# Altium footprint library PCB封装库.PcbLib: 109 footprints (part 3 of 7)
Each footprint in its own frame and in the unit in brackets; x right, y up, seen from the top. Pads: shape width x height; smd on the part's side, far side on the other; paste and mask are expansions set on the pad; w line width, h text height; cw(c..) or ccw(c..) is an arc to the next point about the centre after c.
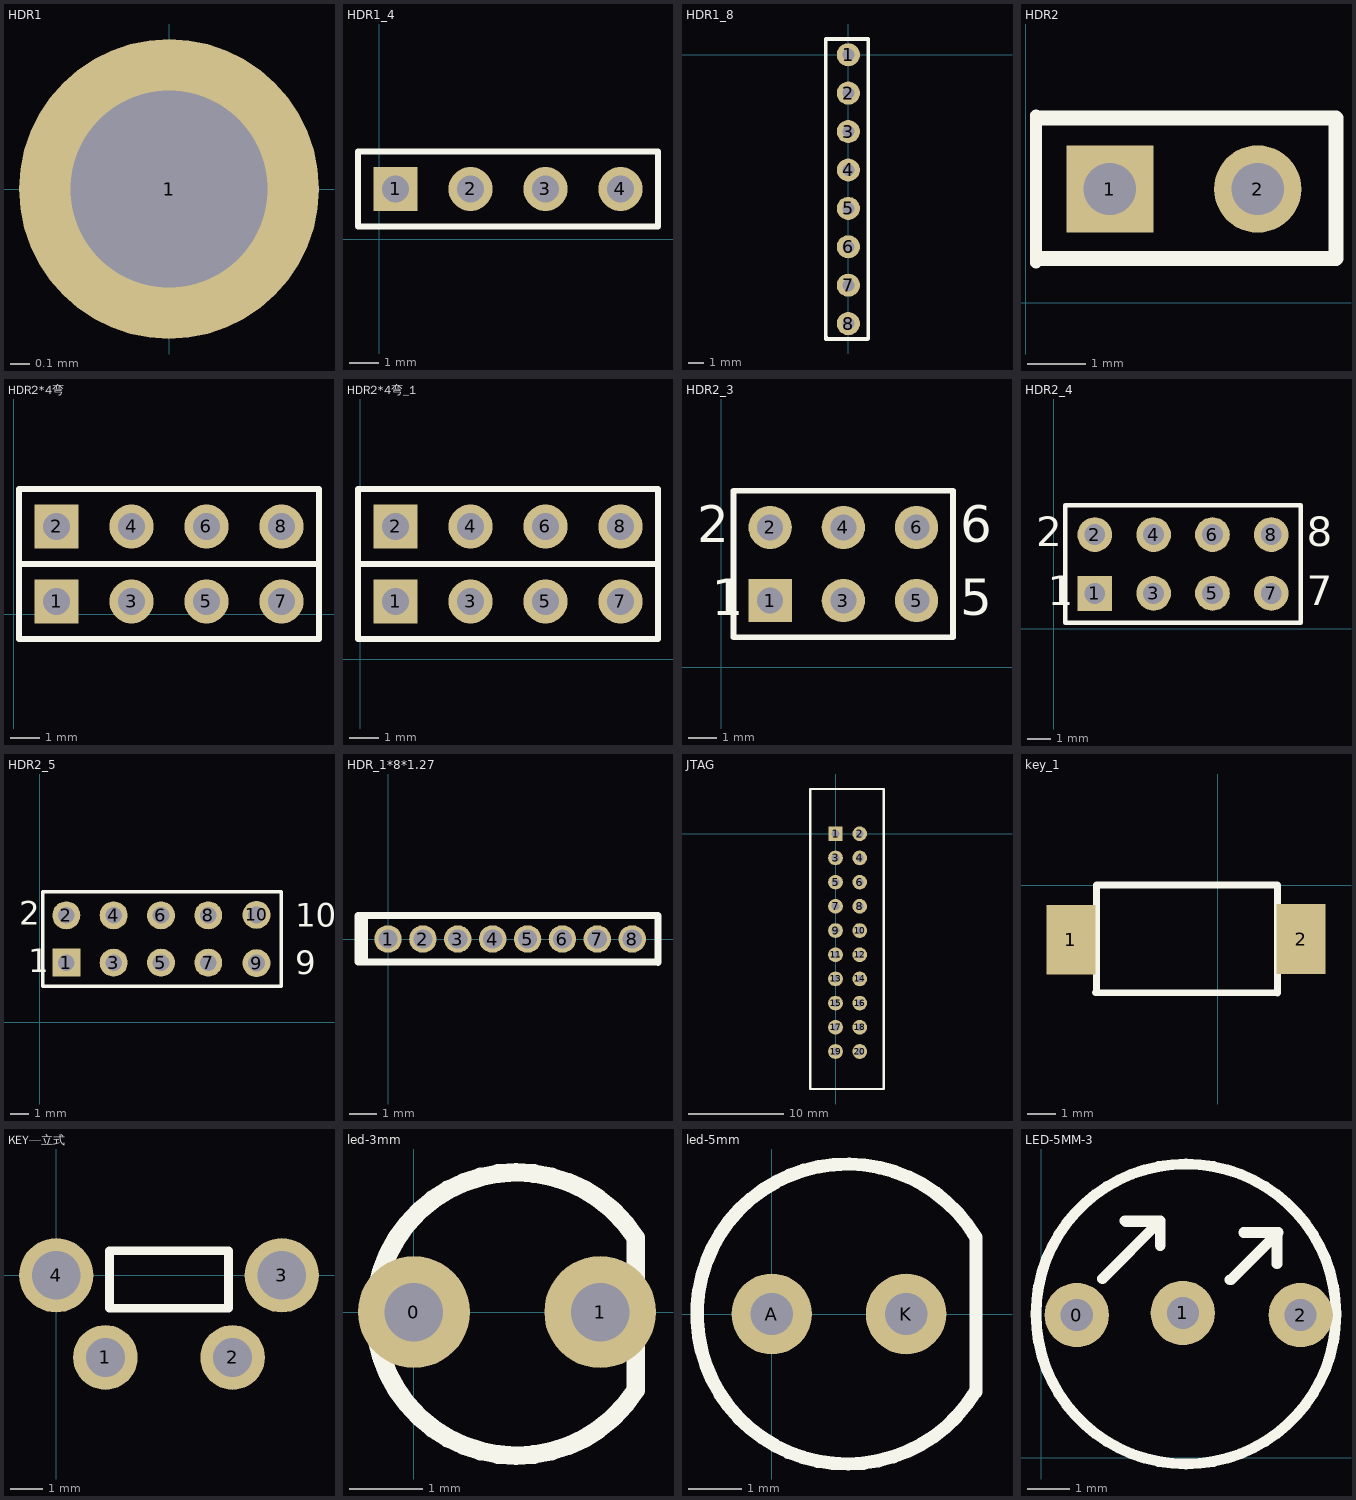
[diagram p2: the footprints below, top view; thin cyan lines are the x and y axes]

## HDR1 [mil]
pads (1):
  round 60 hole 39.37: 1(0,0)

## HDR1_4 [mm]
pads (4):
  rect 1.5x1.5 hole 0.9: 1(0.559,1.702)
  round 1.5 hole 0.9: 2(3.099,1.702) 3(5.639,1.702) 4(8.179,1.702)
Top Overlay:
  lines w0.2: -0.711,0.432 -0.711,2.972 9.449,2.972 9.449,0.432 -0.711,0.432
3D body: height 3.8, standoff -2.5, extent -1.957,-0.807 10.543,7.493

## HDR1_8 [mil]
pads (8):
  round 60 hole 31.5: 1(0,0) 2(0,-100) 3(0,-200) 4(0,-300) 5(0,-400) 6(0,-500) 7(0,-600) 8(0,-700)
Top Overlay:
  lines w10: -59,-740 50,-740 52,-738 52,41 -59,41 -59,-735 -58,-734

## HDR2 [mm]
pads (2):
  rect 1.5x1.5 hole 0.9: 1(1.448,1.956)
  round 1.5 hole 0.9: 2(3.988,1.956)
Top Overlay:
  lines w0.2: 0.178,0.686 0.178,3.226
  lines w0.254: 0.254,0.762 5.334,0.762 5.334,3.175 0.254,3.175

## HDR2*4弯 [mm]
pads (8):
  rect 1.5x1.5 hole 0.9: 1(1.448,0.432) 2(1.448,2.972)
  round 1.5 hole 0.9: 3(3.988,0.432) 4(3.988,2.972) 5(6.528,0.432) 6(6.528,2.972) 7(9.068,0.432) 8(9.068,2.972)
Top Overlay:
  lines w0.2: 0.178,1.702 0.178,-0.838 10.338,-0.838 10.338,1.702 ; 0.178,1.702 10.338,1.702 ; 0.178,1.702 10.338,1.702 ; 0.178,1.702 0.178,4.242 10.338,4.242 10.338,1.702
3D body: height 6.5, standoff -2.25, extent 0.127,-8.768 5.207,3.688
3D body: height 6.5, standoff -2.25, extent 5.207,-8.768 10.287,3.688

## HDR2*4弯_1 [mm]
pads (8):
  rect 1.5x1.5 hole 0.9: 1(1.194,1.956) 2(1.194,4.496)
  round 1.5 hole 0.9: 3(3.734,1.956) 4(3.734,4.496) 5(6.274,1.956) 6(6.274,4.496) 7(8.814,1.956) 8(8.814,4.496)
Top Overlay:
  lines w0.2: -0.076,3.226 -0.076,5.766 10.084,5.766 10.084,3.226 ; -0.076,3.226 10.084,3.226 ; -0.076,3.226 10.084,3.226 ; -0.076,3.226 -0.076,0.686 10.084,0.686 10.084,3.226
3D body: height 6.5, standoff -2.25, extent 4.953,-7.625 10.033,4.831
3D body: height 6.5, standoff -2.25, extent -0.127,-7.625 4.953,4.831

## HDR2_3 [mm]
pads (6):
  rect 1.5x1.5 hole 0.9: 1(1.702,2.311)
  round 1.5 hole 0.9: 2(1.702,4.851) 3(4.242,2.311) 4(4.242,4.851) 5(6.782,2.311) 6(6.782,4.851)
Top Overlay:
  lines w0.2: 3.183,1.041 8.052,1.041 ; 8.052,1.041 0.432,1.041 0.432,6.121 8.052,6.121 8.052,1.041
  text "1" at -0.33,1.803 h1.27
  text "2" at -0.838,4.343 h1.27
  text "5" at 8.306,1.803 h1.27
  text "6" at 8.306,4.343 h1.27
3D body: height 8.54, standoff -3, extent 0.41,1.004 8.03,3.544
3D body: height 8.54, standoff -3, extent 0.432,3.581 8.052,6.121

## HDR2_4 [mm]
pads (8):
  rect 1.5x1.5 hole 0.9: 1(1.778,1.524)
  round 1.5 hole 0.9: 2(1.778,4.064) 3(4.318,1.524) 4(4.318,4.064) 5(6.858,1.524) 6(6.858,4.064) 7(9.398,1.524) 8(9.398,4.064)
Top Overlay:
  lines w0.2: 0.508,0.254 0.508,5.334 10.668,5.334 10.668,0.254 0.508,0.254
  text "8" at 10.922,3.556 h1.27
  text "7" at 10.922,1.016 h1.27
  text "1" at -0.254,1.016 h1.27
  text "2" at -0.762,3.556 h1.27
3D body: height 8.54, standoff -3, extent 0.514,2.775 10.674,5.315
3D body: height 8.54, standoff -3, extent 0.514,0.235 10.674,2.775

## HDR2_5 [mm]
pads (10):
  rect 1.5x1.5 hole 0.9: 1(1.422,3.2)
  round 1.5 hole 0.9: 2(1.422,5.74) 3(3.962,3.2) 4(3.962,5.74) 5(6.502,3.2) 6(6.502,5.74) 7(9.042,3.2) 8(9.042,5.74) 9(11.633,3.175) 10(11.633,5.766)
Top Overlay:
  lines w0.2: 0.152,1.93 0.152,7.01 12.954,7.01 12.954,1.93 0.152,1.93
  text "10" at 13.716,5.131 h1.27
  text "9" at 13.716,2.565 h1.27
  text "1" at -0.61,2.692 h1.27
  text "2" at -1.118,5.232 h1.27
3D body: height 5, standoff -3.13, extent 0.203,1.422 12.903,4.47
3D body: height 5, standoff -3.13, extent 0.203,4.445 12.903,7.493

## HDR_1*8*1.27 [mm]
pads (8):
  round 1 hole 0.7: 1(0,0) 2(1.27,0) 3(2.54,0) 4(3.81,0) 5(5.08,0) 6(6.35,0) 7(7.62,0) 8(8.89,0)
Top Overlay:
  lines w0.254: -0.864,-0.813 -0.864,0.864 9.627,0.864 ; -0.711,0.864 -1.092,0.864 -1.092,-0.838 9.83,-0.838 ; 9.601,0.864 9.83,0.864 9.83,-0.864

## JTAG [mm]
pads (20):
  rect 1.5x1.5 hole 0.8: 1(0,0)
  round 1.54 hole 0.8: 2(2.54,0) 3(0,-2.54) 4(2.54,-2.54) 5(0,-5.08) 6(2.54,-5.08) 7(0,-7.62) 8(2.54,-7.62) 9(0,-10.16) 10(2.54,-10.16) 11(0,-12.7) 12(2.54,-12.7) 13(0,-15.24) 14(2.54,-15.24) 15(0,-17.78) 16(2.54,-17.78) 17(0,-20.32) 18(2.54,-20.32) 19(0,-22.86) 20(2.54,-22.86)
Top Overlay:
  lines w0.245: -2.667,-26.797 -2.667,4.699 5.08,4.699 5.08,-26.797 -2.667,-26.797

## key_1 [mm]
pads (2):
  rect 1.74x2.5 smd: 1(-5.258,-1.956) 2(2.972,-1.93)
Top Overlay:
  lines w0.245: -4.383,-3.849 2.134,-3.861 2.134,0 -4.343,0 -4.343,-3.81

## KEY—立式 [mm]
pads (4):
  round 2 hole 1.2 paste+0: 1(1.524,-2.54) 2(5.461,-2.54)
  round 2.3 hole 1.5 paste+0: 3(6.985,0) 4(0,0)
Top Overlay:
  lines w0.271: 1.651,-1.016 5.334,-1.016 5.334,0.762 1.651,0.762 1.651,-1.016

## led-3mm [mil]
pads (2):
  round 60 hole 31.5: 0(0,0) 1(100,0)
Top Overlay:
  lines w10: 119,-42 cw(c55,-1) 119,40 119,-42

## led-5mm [mil]
pads (2):
  round 60 hole 31.5: A(0,0) K(100,0)
Top Overlay:
  lines w10: 151.56,-57.73 cw(c56,0) 152,57 152,-58
3D body: height 377.95, standoff -236.22, extent -68.8,-114.12 163.48,118.16

## LED-5MM-3 [mil]
pads (3):
  round 60 hole 30: 0(33,133) 1(132,135) 2(242,133)
Top Overlay:
  circle w10: c134.96,134 r140.04
  lines w10: 57,167 111,221 78,221 79,220 111,220 111,198 ; 176,166 177,166 221,210 189,210 219,210 220,209 220,181
3D body: height 472.44, standoff -157.48, extent 18.02,20.04 252,248.39